# Altium schematic symbol library mastermind.SCHLIB: 732 symbols (part 3 of 5)
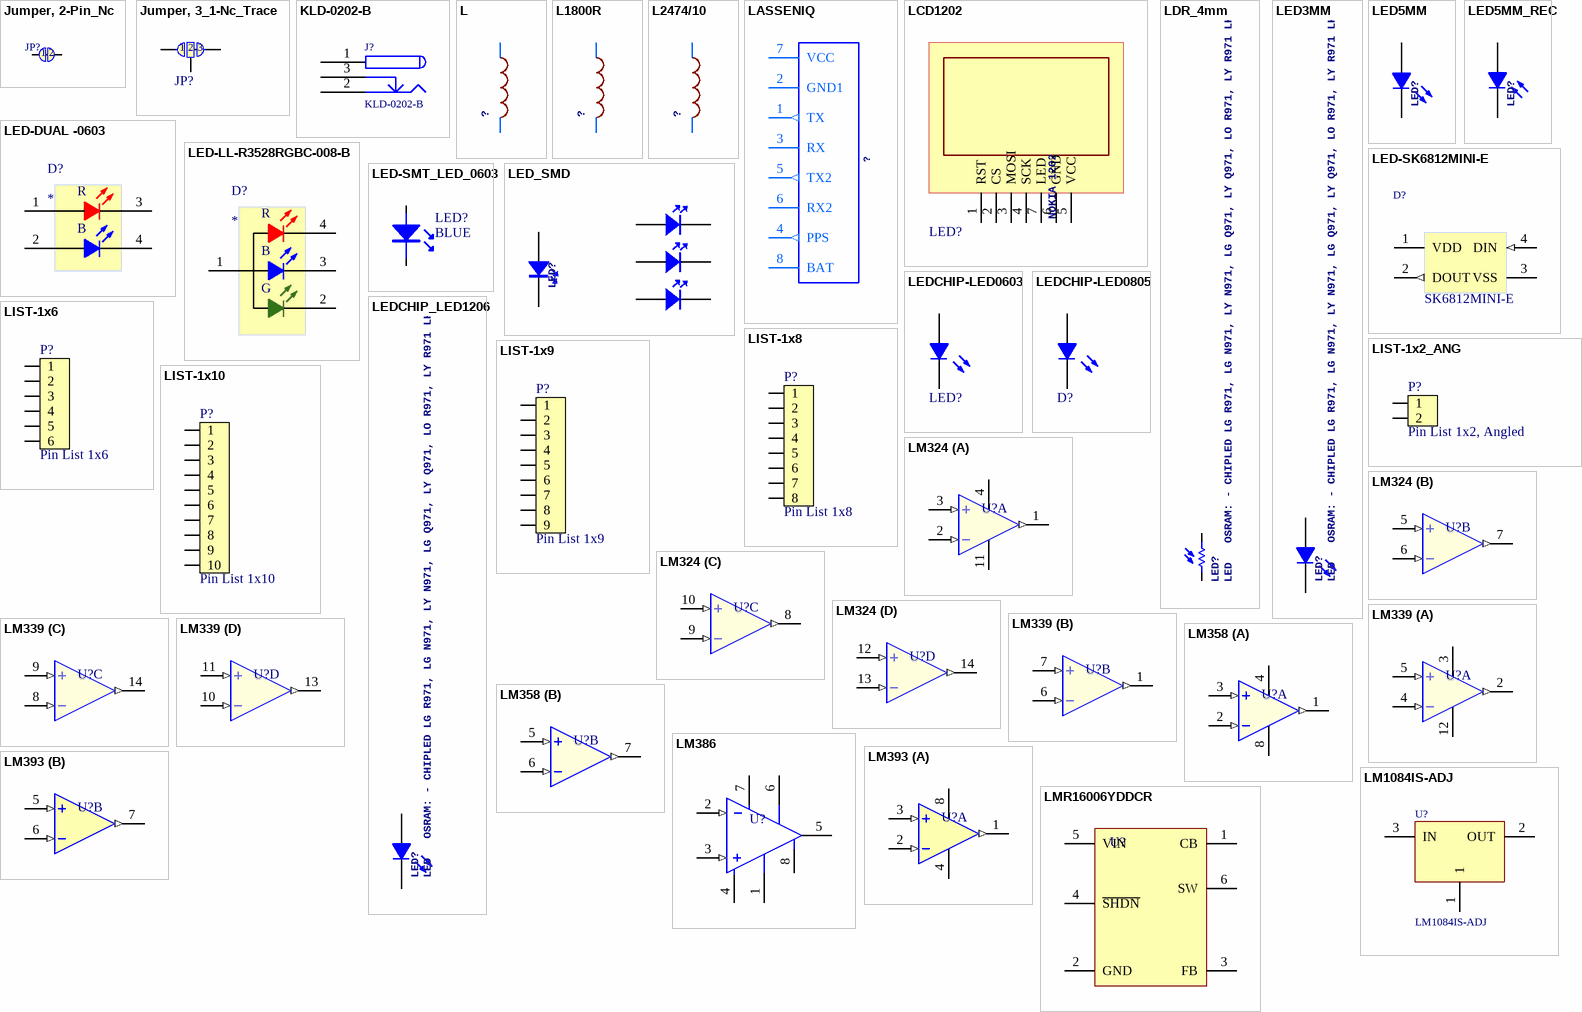
[diagram p36: symbols Jumper, 2-Pin_Nc to LMR16006YDDCR]

## LM339
designator U?, comment National LM3622 li-ion charger    http://www.ladyada.net/library/eagle  (value not drawn)
footprint TSSOP14
part A pins: 2 OA (out), 3 VCC, 4 A- (in), 5 A+ (in), 12 GND
part B pins: 1 OB (out), 6 B- (in), 7 B+ (in)
part C pins: 8 C- (in), 9 C+ (in), 14 OC (out)
part D pins: 10 D- (in), 11 D+ (in), 13 OD (out)

## LM358
designator U?  (value not drawn)
Dual Operational Amplifiers
footprint SOIC-8E (SOIC, 8-Leads, Body 4.90x3.90mm, Pitch 1.27mm, IPC Medium Density)
footprint DIL08-ROUND
part A pins: 1 OA (out), 2 A- (in), 3 A+ (in), 4 GND, 8 VCC
part B pins: 5 B+ (in), 6 B- (in), 7 OB (out)

## LM386
designator U?  (value not drawn)
Audio Amplifiers
footprint SOIC-8E (SOIC, 8-Leads, Body 4.90x3.90mm, Pitch 1.27mm, IPC Medium Density)
footprint DIL08-ROUND
pins: 1 OA, 2 A- (in), 3 A+ (in), 4 GND, 5 VCC, 6 VCC, 7 VCC, 8 VCC

## LM393
designator U?, comment LM393 OP AMP  (value not drawn)
Operational Amplifier
footprint SOP8
footprint DIL08-ROUND
part A pins: 1 OA (out), 2 A- (in), 3 A+ (in), 4 GND, 8 VCC
part B pins: 5 B+ (in), 6 B- (in), 7 OB (out)

## LM1084IS-ADJ
designator U?
5A Low Dropout Possitive Regulators
footprint TO-263
3D model to263 (PCB3D Model)
pins: 1 "Output", 2 OUT (power) "Output", 3 IN (power) "Input"

## LMR16006YDDCR
designator U?  (value not drawn)
BOM_Manufacturer: TI(Tex as Instruments); Contributor: LCSC; BOM_Supplier: LCSC; BOM_Supplier Part: C290195; BOM_Manufacturer Part: LMR16006YDDCR; BOM_JLCPCB Part Class: Extended Part; spicePre: U; spiceSymbolName: LMR16006YDDCR
footprint SOT23-6
pins: 1 CB, 2 GND, 3 FB, 4 ~{SHDN}, 5 VIN, 6 SW

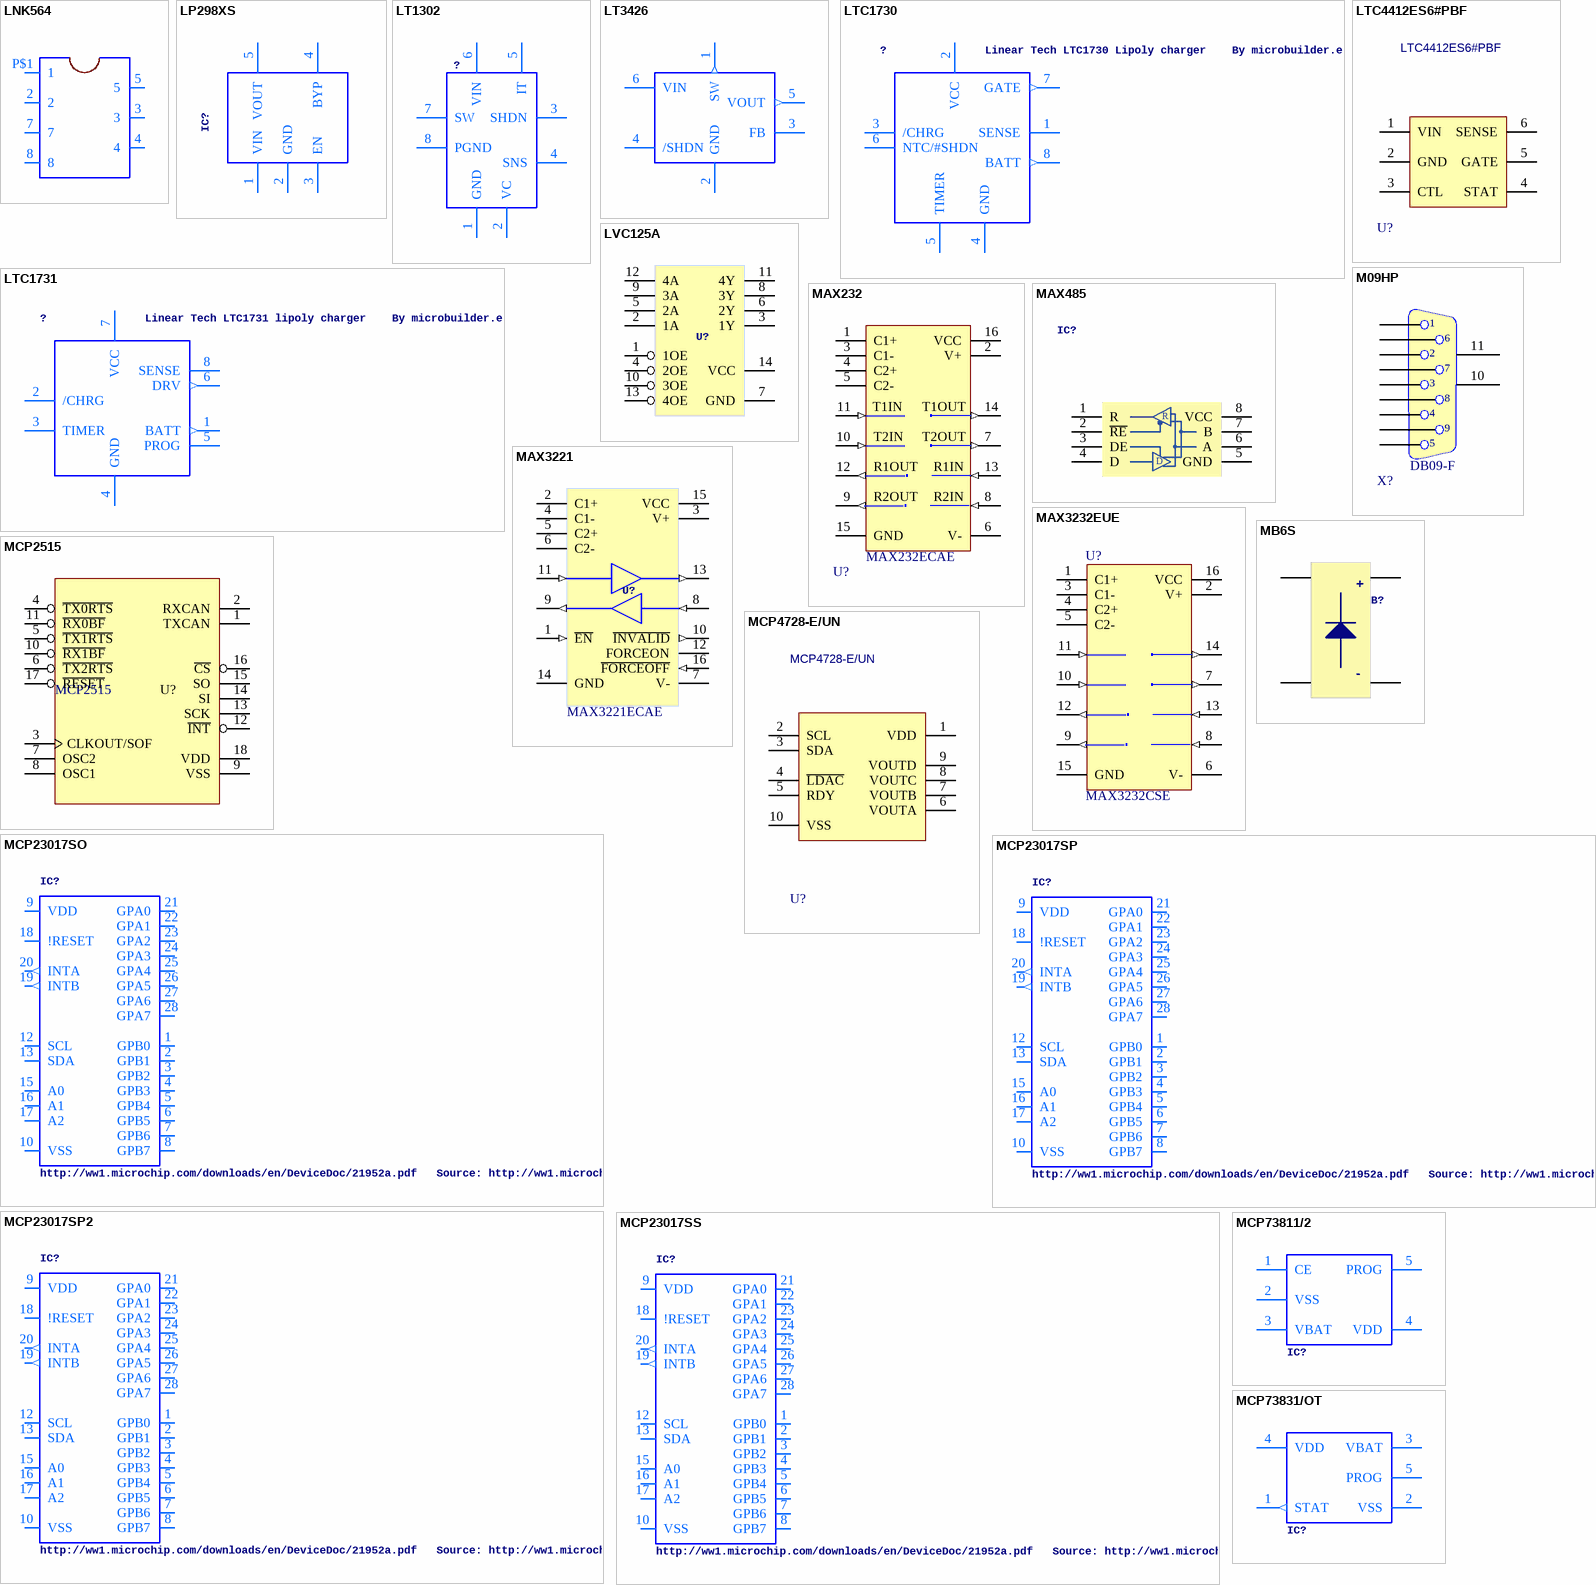
[diagram p15: symbols LNK564 to MCP73831/OT]

## LNK564
designator ?
footprint LNKPACKAGE
pins: 2, 3, 4, 5, 7, 8, P$1 1

## LP298XS
designator IC?
footprint SOT23-5L
pins: 1 VIN, 2 GND, 3 EN, 4 BYP, 5 VOUT

## LT1302
designator ?
footprint DIL08
pins: 1 GND, 2 VC, 3 SHDN, 4 SNS, 5 IT, 6 VIN, 7 SW, 8 PGND

## LT3426
designator ?, comment LT3426   1.2MHz, 2A boost converter in SOT-23    http://www.linear.com/pc/productDetail.jsp?navId=H0,C1,C1003,C1042,C1031,C1061,P8430 (Linear website)  (value not drawn)
footprint SOT23-6
pins: 1 SW (out), 2 GND (oe), 3 FB, 4 /SHDN, 5 VOUT (out), 6 VIN

## LTC1730
designator ?, comment Linear Tech LTC1730 Lipoly charger    By microbuilder.eu
footprint SO08
pins: 1 SENSE, 2 VCC (oe), 3 /CHRG, 4 GND (oe), 5 TIMER, 6 NTC/#SHDN, 7 GATE (out), 8 BATT (out)

## LTC1731
designator ?, comment Linear Tech LTC1731 lipoly charger    By microbuilder.eu
footprint SO08
pins: 1 BATT (out), 2 /CHRG, 3 TIMER, 4 GND (oe), 5 PROG, 6 DRV (out), 7 VCC (oe), 8 SENSE

## LTC4412ES6#PBF
designator U?
Manufacturer: ADI(亚德诺); Supplier: LCSC; Manufacturer Part: LTC4412ES6#PBF; Supplier Part: C107968; JLCPCB Part Class: Extended Part; spicePre: U; spiceSymbolName: LTC4412ES6#PBF
footprint SOT23-6
pins: 1 VIN, 2 GND, 3 CTL, 4 STAT, 5 GATE, 6 SENSE

## LVC125A
designator U?, comment Quad_shift_level_ic  (value not drawn)
74VHC125MCT
footprint TSSOP14
pins: 1 1OE, 2 1A, 3 1Y, 4 2OE, 5 2A, 6 2Y, 7 GND, 8 3Y, 9 3A, 10 3OE, 11 4Y, 12 4A, 13 4OE, 14 VCC

## M09HP
designator X?, comment SUB-D  (value not drawn)
GateName_1: G$1; SymbolName_1: F09; DeviceName: H; LibraryName: con-subd; DeviceSetName: F09; Package: F09H; OC_FARNELL: unknown; OC_NEWARK: unknown
footprint M09HP
pins: 1, 2, 3, 4, 5, 6, 7, 8, 9, 10 1, 11 1
text: DB09-F

## MAX232
designator U?, comment SymbolName_1: MAX232ECAE  (hidden comment: RS232 TRANSCEIVER)
GateName_1: G$1
footprint SO-16
pins: 1 C1+, 2 V+ (power), 3 C1-, 4 C2+, 5 C2-, 6 V- (power), 7 T2OUT (out), 8 R2IN (in), 9 R2OUT (out), 10 T2IN (in), 11 T1IN (in), 12 R1OUT (out), 13 R1IN (in), 14 T1OUT (out), 15 GND (power), 16 VCC (power)

## MAX485
designator IC?  (value not drawn)
RS-485/RS-422 ICs ROHS
footprint SOP8
pins: 1 R, 2 ~{RE}, 3 DE, 4 D, 5 GND (power), 6 A, 7 B (power), 8 VCC (power)

## MAX3221
designator U?, comment SymbolName_1: MAX3221ECAE  (hidden comment: RS232 TRANSCEIVER)
GateName_1: G$1
footprint SSOP16
pins: 1 ~{EN} (in), 2 C1+, 3 V+, 4 C1-, 5 C2+, 6 C2-, 7 V-, 8 (in), 9 (out), 10 ~{INVALID} (out), 11 (in), 12 FORCEON, 13 (out), 14 GND, 15 VCC, 16 ~{FORCEOFF} (in)

## MAX3232EUE
designator U?, comment MAX3232CSE
3.0V TO 5.5V, Low-Power, up to 1Mbps, True RS-232 Transceiver Using Four 0.1µF External Capacitor; Manufacturer: Maxim,ST; Package Information: Latest Revision: 21-0066 C; Class I: Communication; Published: 16-Jan-2001; Revision: July-2002: Re-released for DXP Platform.; Datasheet: Latest Revision: Mar-1999; Package Reference: TSSOP16; Publisher: Altium Limited; Class II: Transceiver; Fitted: True
footprint SO-G16
pins: 1 C1+, 2 V+ (power), 3 C1-, 4 C2+, 5 C2-, 6 V- (power), 7 T2OUT (out), 8 R2IN (in), 9 R2OUT (out), 10 T2IN (in), 11 T1IN (in), 12 R1OUT (out), 13 R1IN (in), 14 T1OUT (out), 15 GND (power), 16 VCC (power)

## MB6S
designator B?
footprint MBS
pins: +, -, AC1, AC2

## MCP2515
designator U?
CAN Controller; Manufacturer: Tokmas(托克马斯); Symbol: MCP2515-I; Add into BOM: yes; Device: MCP2515-I; Supplier: LCSC; Supplier Part: C5250735; Manufacturer Part: MCP2515-I; JLCPCB Part Class: Extended Part; LCSC Part Name: CAN芯片; Supplier Footprint: TSSOP-20; Datasheet: https://atta.szlcsc.com/upload/public/pdf/source/20221108/54102364C5045B746FF767DA10992A5D.pdf; Convert to PCB: yes
footprint SOIC-18_L11.6-W7.5-P1.27-LS10.3-BL
pins: 1 TXCAN, 2 RXCAN, 3 CLKOUT/SOF, 4 ~{TX0RTS}, 5 ~{TX1RTS}, 6 ~{TX2RTS}, 7 OSC2, 8 OSC1, 9 VSS, 10 ~{RX1BF}, 11 ~{RX0BF}, 12 ~{INT}, 13 SCK, 14 SI, 15 SO, 16 ~{CS}, 17 ~{RESET}, 18 VDD

## MCP4728-E/UN
designator U?
12Bit MSOP-10 Digital To Analog Converters (DACs); Manufacturer: MICROCHIP(美国微芯); Contributor: LCSC; Supplier: LCSC; Supplier Part: C108207; Manufacturer Part: MCP4728-E/UN; JLCPCB Part Class: Extended Part; spicePre: U; spiceSymbolName: MCP4728-E/UN
footprint MSOP-10_L3.0-W3.0-P0.50-LS5.0-TL
pins: 1 VDD, 2 SCL, 3 SDA, 4 ~{LDAC}, 5 RDY, 6 VOUTA, 7 VOUTB, 8 VOUTC, 9 VOUTD, 10 VSS

## MCP23017SO
designator IC?, comment http://ww1.microchip.com/downloads/en/DeviceDoc/21952a.pdf   Source: http://ww1.microchip.com/downloads/en/DeviceDoc/21952a.pdf
footprint SO28W
pins: 1 GPB0, 2 GPB1, 3 GPB2, 4 GPB3, 5 GPB4, 6 GPB5, 7 GPB6, 8 GPB7, 9 VDD (power), 10 VSS (power), 12 SCL, 13 SDA, 15 A0, 16 A1, 17 A2, 18 !RESET, 19 INTB (out), 20 INTA (out), 21 GPA0, 22 GPA1, 23 GPA2, 24 GPA3, 25 GPA4, 26 GPA5, 27 GPA6, 28 GPA7

## MCP23017SP
designator IC?, comment http://ww1.microchip.com/downloads/en/DeviceDoc/21952a.pdf   Source: http://ww1.microchip.com/downloads/en/DeviceDoc/21952a.pdf
footprint DIL28-3
pins: 1 GPB0, 2 GPB1, 3 GPB2, 4 GPB3, 5 GPB4, 6 GPB5, 7 GPB6, 8 GPB7, 9 VDD (power), 10 VSS (power), 12 SCL, 13 SDA, 15 A0, 16 A1, 17 A2, 18 !RESET, 19 INTB (out), 20 INTA (out), 21 GPA0, 22 GPA1, 23 GPA2, 24 GPA3, 25 GPA4, 26 GPA5, 27 GPA6, 28 GPA7

## MCP23017SP2
designator IC?, comment http://ww1.microchip.com/downloads/en/DeviceDoc/21952a.pdf   Source: http://ww1.microchip.com/downloads/en/DeviceDoc/21952a.pdf
footprint DIL28-3-ROUND
pins: 1 GPB0, 2 GPB1, 3 GPB2, 4 GPB3, 5 GPB4, 6 GPB5, 7 GPB6, 8 GPB7, 9 VDD (power), 10 VSS (power), 12 SCL, 13 SDA, 15 A0, 16 A1, 17 A2, 18 !RESET, 19 INTB (out), 20 INTA (out), 21 GPA0, 22 GPA1, 23 GPA2, 24 GPA3, 25 GPA4, 26 GPA5, 27 GPA6, 28 GPA7

## MCP23017SS
designator IC?, comment http://ww1.microchip.com/downloads/en/DeviceDoc/21952a.pdf   Source: http://ww1.microchip.com/downloads/en/DeviceDoc/21952a.pdf
footprint SSOP28
pins: 1 GPB0, 2 GPB1, 3 GPB2, 4 GPB3, 5 GPB4, 6 GPB5, 7 GPB6, 8 GPB7, 9 VDD (power), 10 VSS (power), 12 SCL, 13 SDA, 15 A0, 16 A1, 17 A2, 18 !RESET, 19 INTB (out), 20 INTA (out), 21 GPA0, 22 GPA1, 23 GPA2, 24 GPA3, 25 GPA4, 26 GPA5, 27 GPA6, 28 GPA7

## MCP73811/2
designator IC?, comment MCP73811 and MCP73812   Simple, Miniature Single-Cell, Fully Integrated Li-Ion / Li-Polymer Charge Management Controllers  SOT-23-5 package, no indicator LED but with adjustable current, small and very inexpensive  (value not drawn)
footprint SOT23-5L
pins: 1 CE, 2 VSS (power), 3 VBAT, 4 VDD (power), 5 PROG

## MCP73831/OT
designator IC?, comment MCP73831/2   Miniature Single-Cell, Fully Integrated Li-Ion, Li-Polymer Charge Management Controllers.    Nice and small simple lipoly charge controller, with adjustable current and status output (LED)    http://www.ladyada.net/library/pcb/eaglelibrary.html  (value not drawn)
footprint SOT23-5L
pins: 1 STAT (out), 2 VSS (power), 3 VBAT, 4 VDD (power), 5 PROG

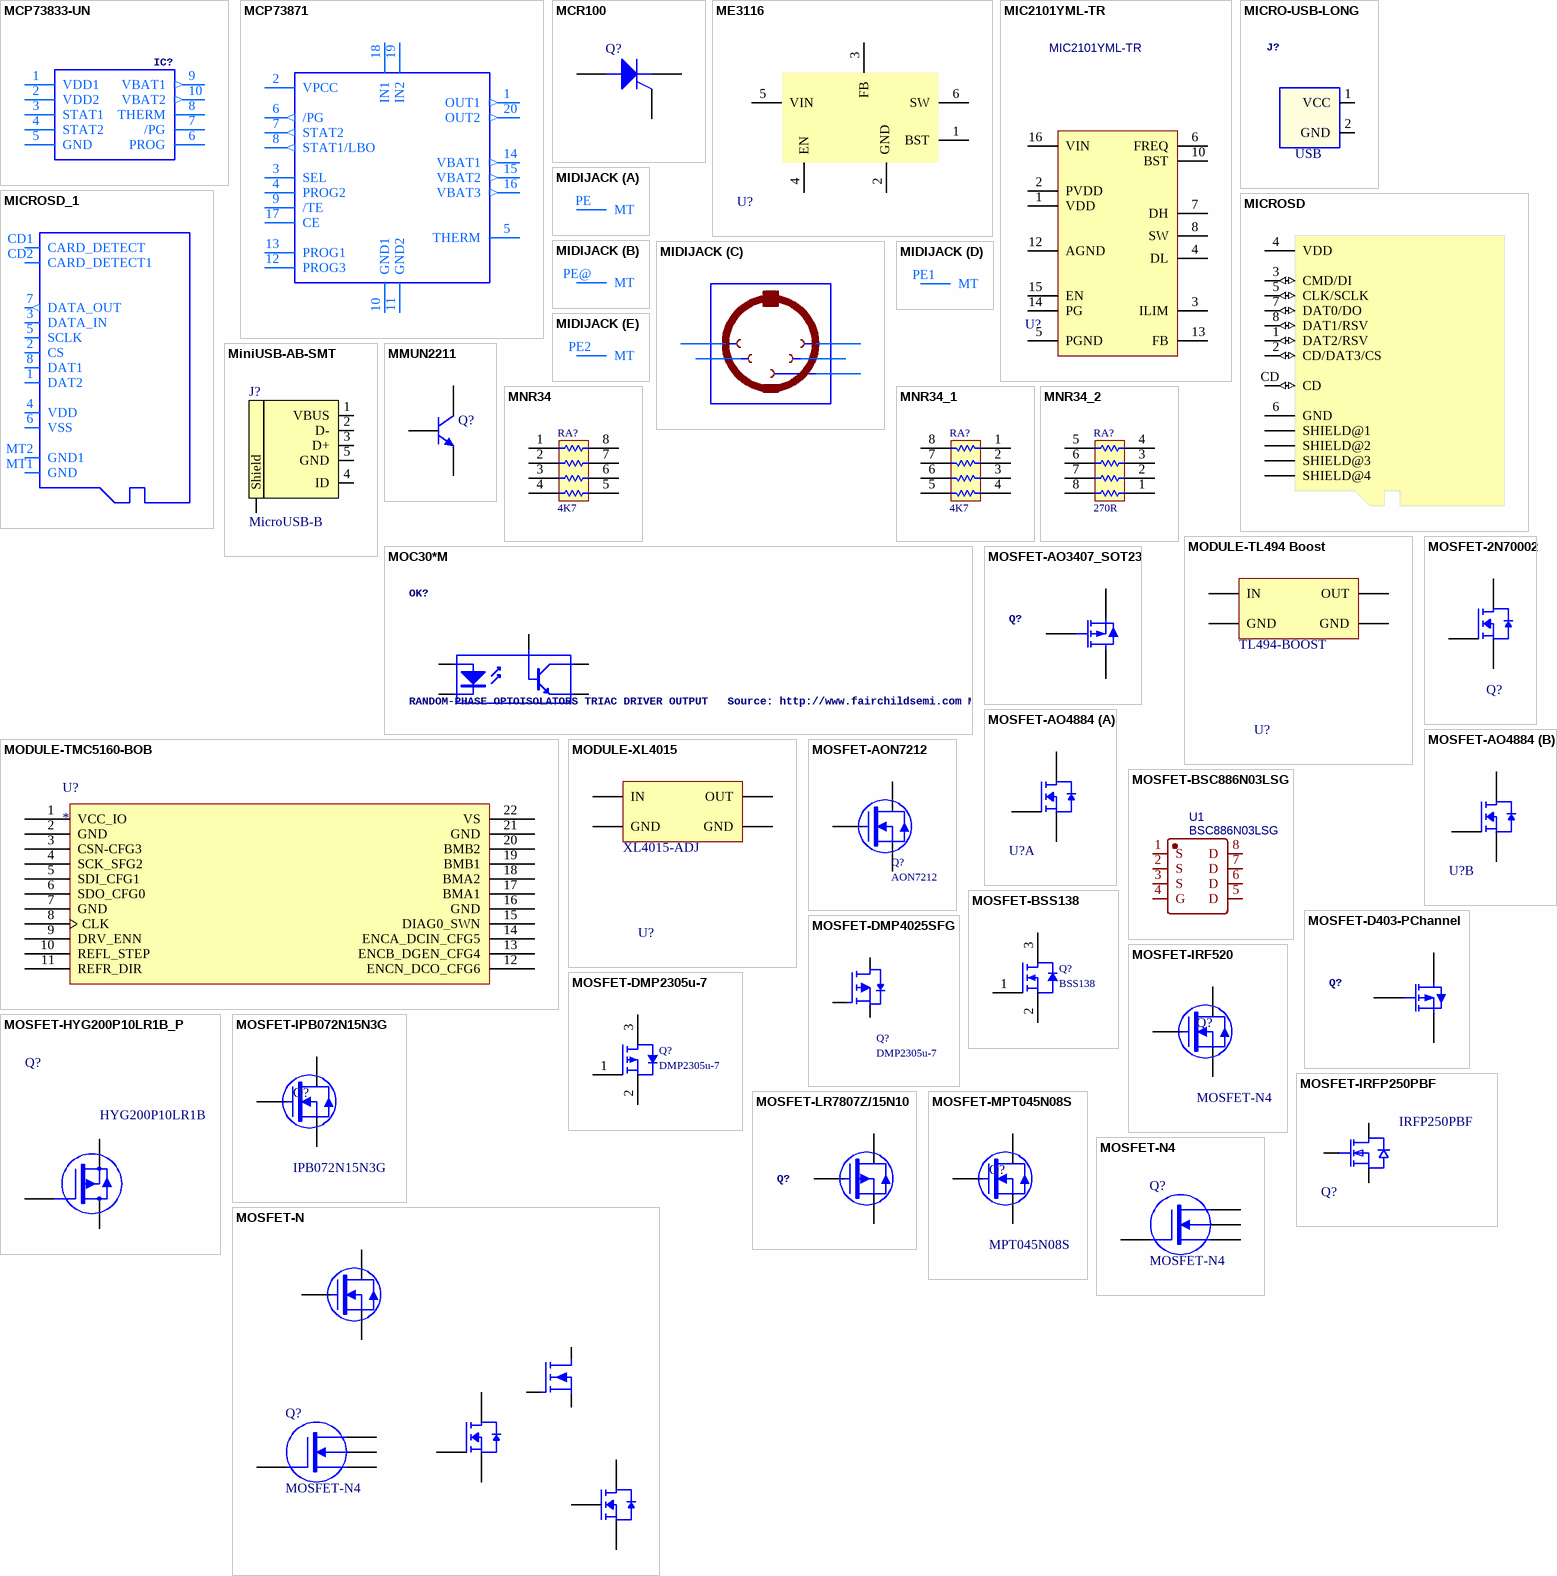
[diagram p16: symbols MCP73833-UN to MOSFET-N4]

## MCP73833-UN
designator IC?
footprint MSOP10
pins: 1 VDD1 (power), 2 VDD2 (power), 3 STAT1, 4 STAT2, 5 GND (power), 6 PROG, 7 /PG, 8 THERM, 9 VBAT1 (out), 10 VBAT2 (out)

## MCP73871
designator IC?
footprint QFN20
pins: 1 OUT1 (out), 2 VPCC, 3 SEL, 4 PROG2, 5 THERM, 6 /PG (out), 7 STAT2 (out), 8 STAT1/LBO (out), 9 /TE, 10 GND1 (power), 11 GND2 (power), 12 PROG3, 13 PROG1, 14 VBAT1 (out), 15 VBAT2 (out), 16 VBAT3 (out), 17 CE, 18 IN1, 19 IN2, 20 OUT2 (out)

## MCR100
designator Q?
Silicon Controlled Rectifier; Published: 8-Jun-2000; LatestRevisionDate: 17-Jul-2002; LatestRevisionNote: Re-released for DXP Platform.; PackageReference: TO-220-AB; Publisher: Altium Limited; Code_JEDEC: TO-220-AB
simulation model SCR (Spice Subcircuit)
footprint SOT23
pins: 1 K, 2 G, 3 A

## ME3116
designator U?  (value not drawn)
DC-DC Converters SOT-23-6
footprint SOT23-6
pins: 1 BST (power), 2 GND, 3 FB, 4 EN (power), 5 VIN, 6 SW

## MIC2101YML-TR
designator U?
DC-DC Converters MLF-16; Manufacturer: MICROCHIP(美国微芯); Contributor: lcsc; Supplier: LCSC; Supplier Part: C621528; Manufacturer Part: MIC2101YML-TR; spicePre: U; spiceSymbolName: MIC2101YML-TR
footprint VQFN-16_L3.0-W3.0-P0.50-BL-EP1.7
pins: 1 VDD, 2 PVDD, 3 ILIM, 4 DL, 5 PGND, 6 FREQ, 7 DH, 8 SW, 9 GND hidden to GND, 10 BST, 11 GND hidden to GND, 12 AGND, 13 FB, 14 PG, 15 EN, 16 VIN, 17 GND hidden to GND

## MICRO-USB-LONG
designator J?
GateName_1: G$1; SymbolName_1: MICRO-USB-LONG; LibraryName: microusb; DeviceSetName: MICRO-USB-LONG; Package: MICRO_USB_LONG
footprint MICRO_USB_LONG
pins: 1 VCC (power), 2 GND (power)
text: USB

## MICROSD
designator ?, comment Micro-SD / Transflash card holder with SPI pinout   For the 3M # 2908-05WB-MG and/or 4UCON #19656 push-push type  (value not drawn)
GateName_1: G$1; DeviceSetName: MICROSD; SymbolName_1: TRANSFLASH; LibraryName: micro-sd; Package: C12075
footprint C12075
pins: 1 DAT2/RSV (io), 2 CD/DAT3/CS (io), 3 CMD/DI (io), 4 VDD (power), 5 CLK/SCLK (io), 6 GND (power), 7 DAT0/DO (io), 8 DAT1/RSV (io), CD (io), GND@1 SHIELD@1 (power), GND@2 SHIELD@2 (power), GND@3 SHIELD@3 (power), GND@4 SHIELD@4 (power)

## MICROSD_1
designator ?, comment Micro-SD / Transflash card holder with SPI pinout   For the 3M # 2908-05WB-MG and/or 4UCON #19656 push-push type  (value not drawn)
footprint MICROSD
pins: 1 DAT2, 2 CS, 3 DATA_IN, 4 VDD (oe), 5 SCLK, 6 VSS (oe), 7 DATA_OUT (out), 8 DAT1, CD1 CARD_DETECT, CD2 CARD_DETECT1, MT1 GND (oe), MT2 GND1 (oe)

## MIDIJACK
designator ?, comment DIN 5 jack also known as MIDI jackA modification of conn-hirshman:MAB5SH with two options for the grounding 'teeth'  (value not drawn)
footprint CP-2350
part A pins: PE MT
part B pins: PE@ MT
part C pins: 1, 2, 3, 4, 5
part D pins: PE1 MT
part E pins: PE2 MT

## MiniUSB-AB-SMT
designator J?, comment MicroUSB-B
MicroUSB-B-SMT; Part Number: USB-Micro-B-RA-SMD-PiP; Manufacturer: Allen Creations Corp.; Manufacturer Part Number: AJU55-BS2111-L; 2nd source part number: 609-4616-1-ND; Artikkelnr Noca: 55029020; Artikkelnr Simpro: N.A.; Datasheet: \\hizz\pro\app9717\Datasheet\connectores\Allen Creations Corp\AJU-211.pdf; Footprint Doc: USB-Micro-B-RA-SMD-PiP; LatestRevisionDate: 2016-04-21; Pin Count: 5; Publisher: Nordic Semiconductor; Published: 2014-10-07; Value: MicroUSB-B; Note: *; Supplier: Cabcon; Supplier part number: AJU55-BS2111-L; 2nd source Supplier: Digi-Key
footprint USB-Micro-B-RA-SMD-PiP
pins: 1 VBUS (power), 2 D-, 3 D+, 4 ID, 5 GND (power), 6 Shield (power)

## MMUN2211
designator Q?
NPN Bipolar Transistor; Published: 8-Jun-2000; LatestRevisionDate: 17-Jul-2002; LatestRevisionNote: Re-released for DXP Platform.; PackageReference: TO-226-AA; Publisher: Altium Limited; PackageDescription: TO, Flat Index; 3 In-Line, Axial Leads; Body Dia. 4.8mm; Leads 0.55 x 0.51 mm (max); Code_JEDEC: TO-226-AA
simulation model NPN
signal-integrity model NPN
footprint SOT23
pins: 1 B, 2 E, 3 C

## MNR34
designator RA?, comment 4K7
3216x4 Resistor Array; AEMS Code: 1300330
footprint MNR34
footprint MNR34T
pins: 1, 2, 3, 4, 5, 6, 7, 8

## MNR34_1
designator RA?, comment 4K7
3216x4 Resistor Array; AEMS Code: 1300330
footprint MNR34
footprint MNR34T
pins: 1, 2, 3, 4, 5, 6, 7, 8

## MNR34_2
designator RA?, comment 270R
3216x4 Resistor Array; AEMS Code: 1310010
footprint MNR34
pins: 1, 2, 3, 4, 5, 6, 7, 8

## MOC30*M
designator OK?, comment RANDOM-PHASE OPTOISOLATORS TRIAC DRIVER OUTPUT   Source: http://www.fairchildsemi.com MOC3020-M.pdf
footprint DIL06F
pins: 1 A "Anode", 2 K "Cathode", 4 C "Collector", 5 B "Base", 6 E "Emitter"

## MODULE-TL494 Boost
designator U?
footprint MODULE-TL494
pins: 1 IN, 2 GND, 3 OUT, 4 GND
text: TL494-BOOST

## MODULE-TMC5160-BOB
designator U?
This board was developed for applications and installations where space is premium and projects are made as permanent set ups. Small, available in 3.3 V and 5 V versions, powered by ATmega328P.; MP: Arduino Pro Mini; MF: Arduino; Price: None; Availability: Not in stock; Package: None; Value: *; SnapEDA_Link: https://www.snapeda.com/parts/Arduino%20Pro%20Mini/Arduino/view-part/?ref=snap; Check_prices: https://www.snapeda.com/parts/Arduino%20Pro%20Mini/Arduino/view-part/?ref=eda
footprint Module_tmc5160_bob
pins: 1 VCC_IO (power), 2 GND (power), 3 CSN-CFG3, 4 SCK_SFG2, 5 SDI_CFG1, 6 SDO_CFG0, 7 GND, 8 CLK, 9 DRV_ENN, 10 REFL_STEP, 11 REFR_DIR, 12 ENCN_DCO_CFG6, 13 ENCB_DGEN_CFG4, 14 ENCA_DCIN_CFG5, 15 DIAG0_SWN, 16 GND, 17 BMA1, 18 BMA2, 19 BMB1, 20 BMB2, 21 GND (power), 22 VS (power)

## MODULE-XL4015
designator U?
footprint MODULE-XL4015
pins: 1 IN, 2 GND, 3 OUT, 4 GND
text: XL4015-ADJ

## MOSFET-2N70002
designator Q?, comment 2N7002  (value not drawn)
N-Channel Mosfet 2N7002E - 60V 260mA SOT23
footprint SOT23
pins: 1 G "Gate", 2 S "Drain", 3 D "Source"

## MOSFET-AO3407_SOT23
designator Q?
footprint SOT23
pins: 1 G, 2 S, 3 D

## MOSFET-AO4884
designator U?, comment AO4884  (value not drawn)
Dual N-Channel 40V 10A  27mΩ  SOP8; Manufacturer: HXY MOSFET(华轩阳电子); Manufacturer Part: AO4884-HXY; Contributor: lcsc; Supplier: LCSC; Supplier Part: C5148656; JLCPCB Part Class: Extended Part; spicePre: U; spiceSymbolName: AO4884_C5148656
footprint SOIC-8E (SOIC, 8-Leads, Body 4.90x3.90mm, Pitch 1.27mm, IPC Medium Density); pin to pad 5>5+6 7>7+8
part A pins: 1 S "Drain", 2 G "Gate", 7 D "Source"
part B pins: 3 S "Drain", 4 G "Gate", 5 D "Source"

## MOSFET-AON7212
designator Q?, comment AON7212
N Channel Mosfet 30V 40A dfn-8
footprint POWERDI3333-8_L3.3-W3.3-P0.65-BL
pins: 1 G, 2 S, 3 D

## MOSFET-BSC886N03LSG
designator U1, comment BSC886N03LSG
Manufacturer: Infineon(英飞凌); Contributor: lcsc; Supplier: LCSC; Supplier Part: C3275891; Manufacturer Part: BSC886N03LSG; spicePre: U; spiceSymbolName: BSC886N03LSG
footprint PG-TDSON-8_L5.0-W6.0-P1.27-BL-EP
pins: 1 S, 2 S, 3 S, 4 G, 5 D, 6 D, 7 D, 8 D

## MOSFET-BSS138
designator Q?, comment BSS138
N Channel Mosfet
footprint SOT23
pins: 1 "Gate", 2 "Source", 3 "Drain"

## MOSFET-D403-PChannel
designator Q?
footprint TO252
pins: 1 G, 2 S, 3 D

## MOSFET-DMP2305u-7
designator Q?, comment DMP2305u-7
P Channel Mosfet
footprint SOT23
pins: 1 "Gate", 2 "Source", 3 "Drain"

## MOSFET-DMP4025SFG
designator Q?, comment DMP2305u-7
P Channel Mosfet
footprint POWERDI3333-8_L3.3-W3.3-P0.65-BL
pins: 1 G, 2 S, 3 D

## MOSFET-HYG200P10LR1B_P
designator Q?, comment HYG200P10LR1B
P-Channel MOSFET,  100V 80A Externally Terminated Substrate; Published: 24-Mar-1999; LatestRevisionDate: 29-May-2009; LatestRevisionNote: IPC-7351 Footprint Added.; PackageVersion: Sep-2000; PackageReference: SOT-343; Publisher: Altium Limited; PackageDescription: 4-Pin SOT-343 Package 1.3 mm Pitch, 2.1 mm Lead Span
footprint TO-263-2
pins: 1 G, 2 D, 3 S

## MOSFET-IPB072N15N3G
designator Q?, comment IPB072N15N3G
N-Channel MOSFET,  100V 80A  7.2mΩ; Published: 24-Mar-1999; LatestRevisionDate: 29-May-2009; LatestRevisionNote: IPC-7351 Footprint Added.; PackageVersion: Sep-2000; PackageReference: SOT-343; Publisher: Altium Limited; PackageDescription: 4-Pin SOT-343 Package 1.3 mm Pitch, 2.1 mm Lead Span
footprint TO-263-2
pins: 1 G, 2 D, 3 S

## MOSFET-IRF520
designator Q?, comment MOSFET-N4
N-Channel MOSFET; Published: 24-Mar-1999; LatestRevisionDate: 29-May-2009; LatestRevisionNote: IPC-7351 Footprint Added.; PackageVersion: Sep-2000; PackageReference: SOT-343; Publisher: Altium Limited; PackageDescription: 4-Pin SOT-343 Package 1.3 mm Pitch, 2.1 mm Lead Span
footprint TO220
pins: 1 G, 2 D, 3 S

## MOSFET-IRFP250PBF
designator Q?, comment IRFP250PBF
N-Channel; Manufacturer: VISHAY(威世); Add into BOM: yes; Drain Source On Resistance (RDS(on)@Vgs,Id): 85mΩ@10V,18A; Gate Threshold Voltage (Vgs(th)@Id): 4V@250uA; Total Gate Charge (Qg@Vgs): 140nC@10V; Input Capacitance (Ciss@Vds): 2.8nF@25V; Symbol: IRFP250PBF; Device: IRFP250PBF; Supplier: LCSC; Manufacturer Part: IRFP250PBF; Supplier Part: C11749; JLCPCB Part Class: Extended Part; LCSC Part Name: N沟道 耐压:200V 电流:30A; Supplier Footprint: TO-247AC-3; Datasheet: https://atta.szlcsc.com/upload/public/pdf/source/20130302/1457706596399.pdf; Convert to PCB: yes; Operating Temperature: -55℃~+150℃@(Tj); Name: IRFP250PBF
footprint TO-247AC-3_L15.8-W5.0-P5.46-L
pins: 1 G, 2 D, 3 S

## MOSFET-LR7807Z/15N10
designator Q?
P-
footprint TO252
footprint TO254P-3N
pins: 1 G, 2 D, 3 S

## MOSFET-MPT045N08S
designator Q?, comment MPT045N08S
N-Channel MOSFET,  85V 138A  4.4mΩ; Published: 24-Mar-1999; LatestRevisionDate: 29-May-2009; LatestRevisionNote: IPC-7351 Footprint Added.; PackageVersion: Sep-2000; PackageReference: SOT-343; Publisher: Altium Limited; PackageDescription: 4-Pin SOT-343 Package 1.3 mm Pitch, 2.1 mm Lead Span
footprint TO-263-2
pins: 1 G, 2 D, 3 S

## MOSFET-N
designator Q?, comment MOSFET-N4
N-Channel MOSFET; Published: 24-Mar-1999; LatestRevisionDate: 29-May-2009; LatestRevisionNote: IPC-7351 Footprint Added.; PackageVersion: Sep-2000; PackageReference: SOT-343; Publisher: Altium Limited; PackageDescription: 4-Pin SOT-343 Package 1.3 mm Pitch, 2.1 mm Lead Span
pins: 1 G, 1 G "Gate", 1 G, 1 G, 1 G "Gate", 2 D, 2 S "Drain", 2 S, 2 D, 2 S "Drain", 3 U, 3 D "Source", 3 D, 3 D "Source", 4 S, 4 S

## MOSFET-N4
designator Q?
N-Channel MOSFET, Externally Terminated Substrate; Published: 24-Mar-1999; LatestRevisionDate: 29-May-2009; LatestRevisionNote: IPC-7351 Footprint Added.; PackageVersion: Sep-2000; PackageReference: SOT-343; Publisher: Altium Limited; PackageDescription: 4-Pin SOT-343 Package 1.3 mm Pitch, 2.1 mm Lead Span
footprint SOT-343_N (SOT343, 4-Leads, Body 2x1.3 mm, Pitch 1.3mm, Lead Span 2.1mm, IPC Medium Density)
footprint SOT-343_L (SOT343, 4-Leads, Body 2x1.3 mm, Pitch 1.3mm, Lead Span 2.1mm, IPC High Density)
footprint SOT-343_M (SOT343, 4-Leads, Body 2x1.3 mm, Pitch 1.3mm, Lead Span 2.1mm, IPC Low Density)
simulation model NMOS (MOSFET-N)
pins: 1 G, 2 D, 3 U, 4 S

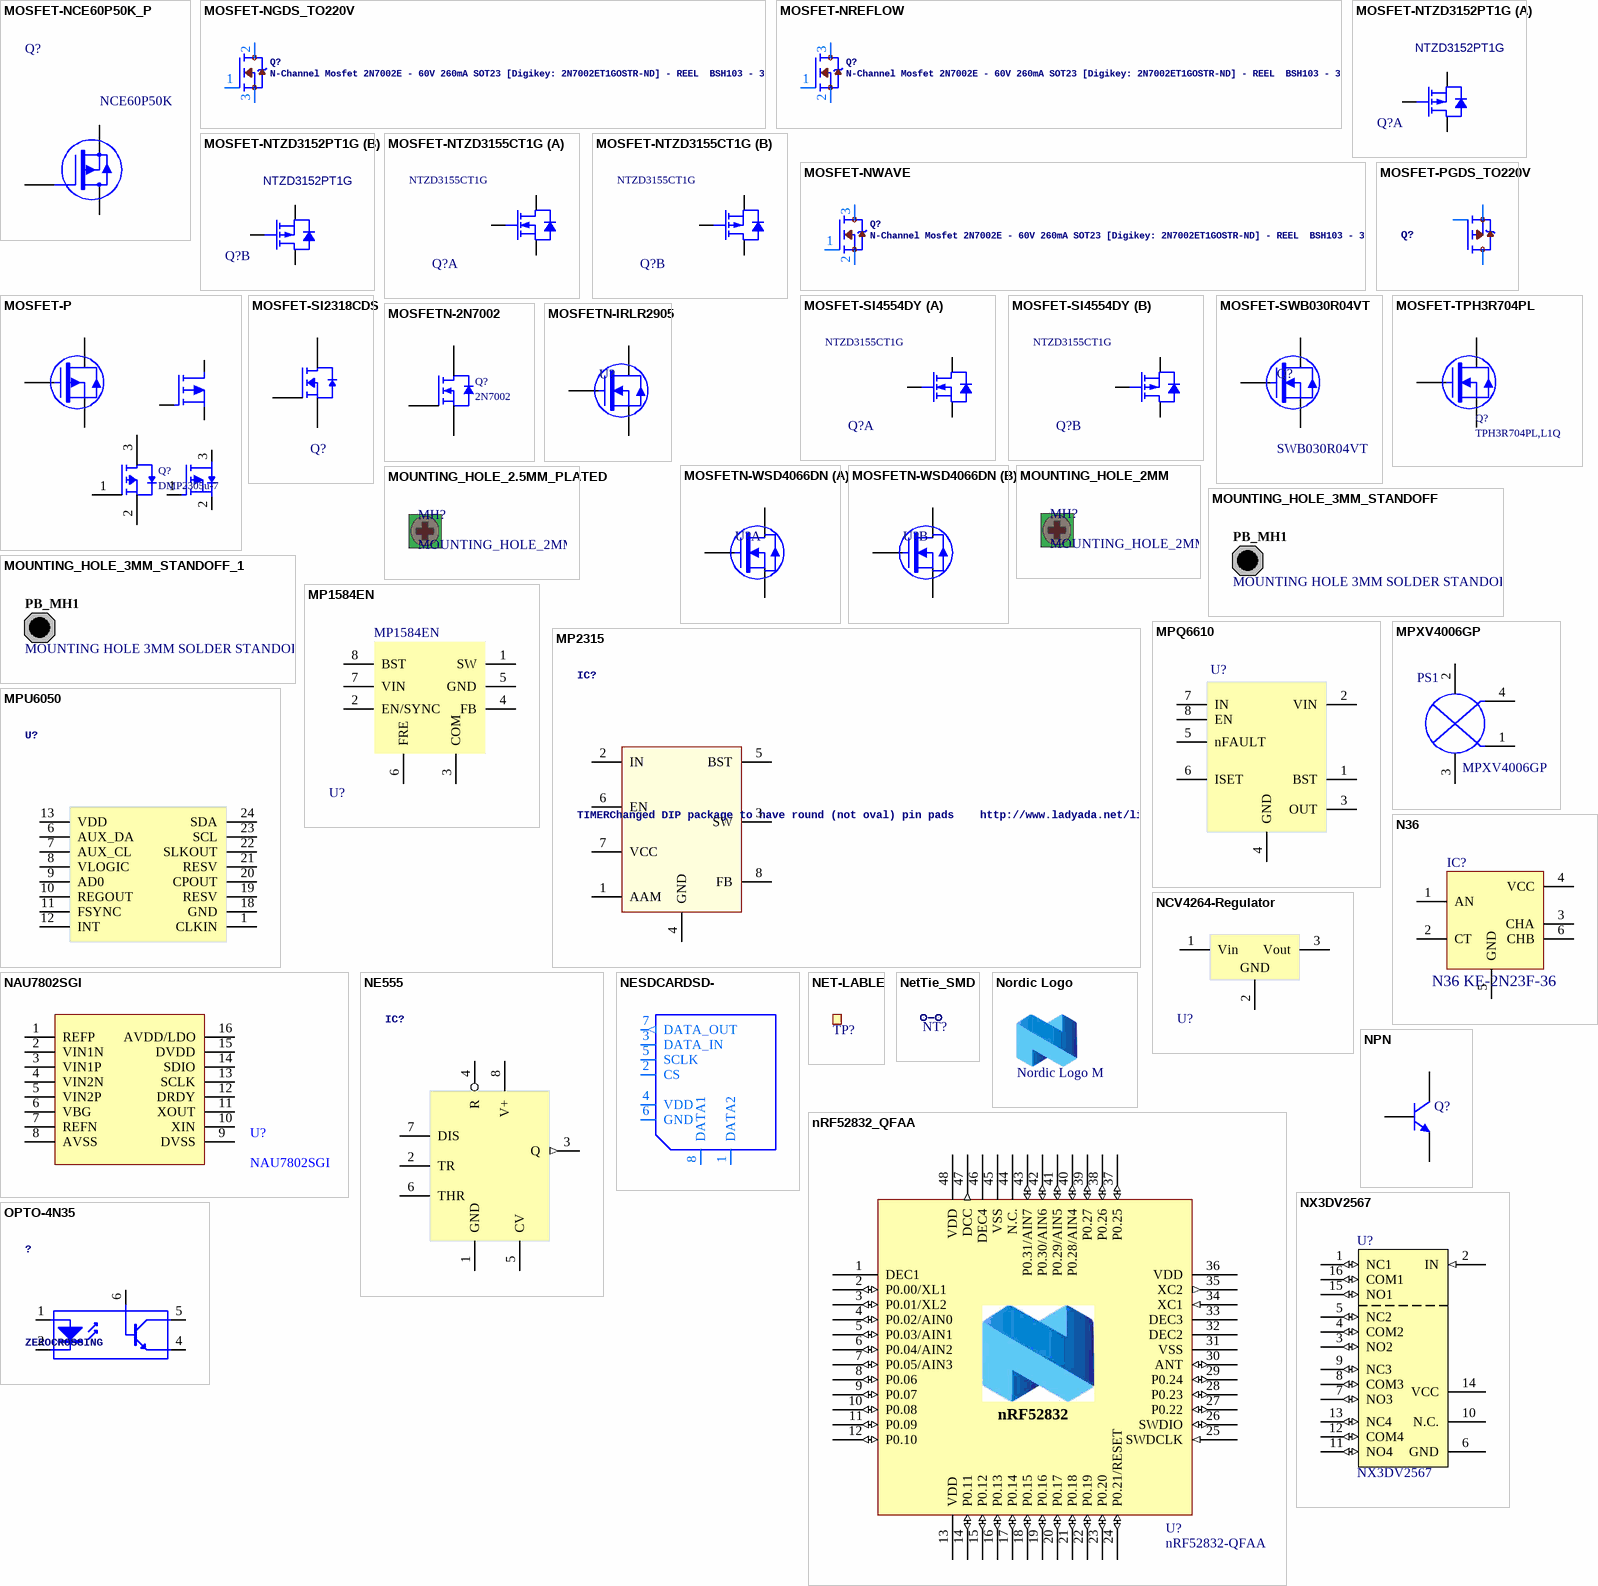
[diagram p17: symbols MOSFET-NCE60P50K_P to OPTO-4N35]

## MOSFET-NCE60P50K_P
designator Q?, comment NCE60P50K
P-Channel MOSFET,  60V 50A; Published: 24-Mar-1999; LatestRevisionDate: 29-May-2009; LatestRevisionNote: IPC-7351 Footprint Added.; PackageVersion: Sep-2000; PackageReference: SOT-343; Publisher: Altium Limited; PackageDescription: 4-Pin SOT-343 Package 1.3 mm Pitch, 2.1 mm Lead Span
footprint TO252
pins: 1 G, 2 S, 3 D

## MOSFET-NGDS_TO220V
designator Q?, comment N-Channel Mosfet 2N7002E - 60V 260mA SOT23 [Digikey: 2N7002ET1GOSTR-ND] - REEL  BSH103 - 30V 850mA SOT23 [Digikey: 568-5013-1-ND]
footprint TO220V
pins: 1 G, 2 D, 3 S

## MOSFET-NREFLOW
designator Q?, comment N-Channel Mosfet 2N7002E - 60V 260mA SOT23 [Digikey: 2N7002ET1GOSTR-ND] - REEL  BSH103 - 30V 850mA SOT23 [Digikey: 568-5013-1-ND]
footprint SOT23
pins: 1 G, 2 S, 3 D

## MOSFET-NTZD3152PT1G
designator Q?, comment NTZD3152PT1G
Dual P-Channel MOSFET 20V 1A; Manufacturer: TECH PUBLIC(台舟); Contributor: lcsc; Supplier: LCSC; Supplier Part: C7472928; Manufacturer Part: NTZD3152PT1G; spicePre: U; spiceSymbolName: NTZD3152PT1G_C7472928
footprint SOT-563_L1.6-W1.2-P0.50-LS1.6-BR
part A pins: 1 S, 2 G, 6 D
part B pins: 3 D, 4 S, 5 G

## MOSFET-NTZD3155CT1G
designator Q?, comment NTZD3155CT1G
N- and P-Channel MOSFET 20V; Manufacturer Name: ONSemi; Manufacturer Part No.: NTZD3155CT1G
footprint SOTFL50P160X60-6N
part A pins: 1 S, 2 G, 6 D
part B pins: 3 D, 4 S, 5 G

## MOSFET-NWAVE
designator Q?, comment N-Channel Mosfet 2N7002E - 60V 260mA SOT23 [Digikey: 2N7002ET1GOSTR-ND] - REEL  BSH103 - 30V 850mA SOT23 [Digikey: 568-5013-1-ND]
footprint SOT23-W
pins: 1 G, 2 S, 3 D

## MOSFET-P
designator Q?, comment DMP2305u-7
P Channel Mosfet
pins: 1 "Gate", 1 G, 1 G, 1 G, 2 "Source", 2 S, 2 D, 2 D, 3 "Drain", 3 D, 3 S, 4 S

## MOSFET-PGDS_TO220V
designator Q?
footprint TO220V
pins: 1 G, 2 D, 3 S

## MOSFET-SI2318CDS
designator Q?, comment SI2318CDS  (value not drawn)
N-Channel Mosfet- 40V 5.6A
footprint SOT23
pins: 1 G "Gate", 2 S "Drain", 3 D "Source"

## MOSFET-SI4554DY
designator Q?, comment Manufacturer Part No.: NTZD3155CT1G  (hidden comment: Verfiy PinS first)
N&P-Channel MOSFET 40V 8A; Manufacturer Name: ONSemi
footprint SOIC-8E (SOIC, 8-Leads, Body 4.90x3.90mm, Pitch 1.27mm, IPC Medium Density)
part A pins: 1 S, 2 G, 6 D
part B pins: 3 D, 4 S, 5 G

## MOSFET-SWB030R04VT
designator Q?, comment SWB030R04VT
N-Channel MOSFET,  40V 130A  2.8mΩ; Published: 24-Mar-1999; LatestRevisionDate: 29-May-2009; LatestRevisionNote: IPC-7351 Footprint Added.; PackageVersion: Sep-2000; PackageReference: SOT-343; Publisher: Altium Limited; PackageDescription: 4-Pin SOT-343 Package 1.3 mm Pitch, 2.1 mm Lead Span
footprint TO-263-2
pins: 1 G, 2 D, 3 S

## MOSFET-TPH3R704PL
designator Q?, comment TPH3R704PL,L1Q
N Channel Mosfet 40V 92A dfn-8
footprint POWERDI3333-8_L3.3-W3.3-P0.65-BL
pins: 1 G, 2 S, 3 D

## MOSFETN-2N7002
designator Q?, comment 2N7002
N Channel Mosfet
footprint SOT23
pins: 1 "Gate", 2 "Source", 3 "Drain"

## MOSFETN-IRLR2905
designator U?, comment IRLR2905  (value not drawn)
55V 42A  27mΩ  TO-252
footprint TO252
pins: 1 G, 2 S, 3 D

## MOSFETN-WSD4066DN
designator U?, comment WSD4066DN  (value not drawn)
Dual Mosfet in one package
footprint DFN-8_L3.2-W3.1-P0.65-LS3.4-BL-EP; pin to pad 6>5+6 8>7+8
part A pins: 1 S1, 2 G1, 8 D1
part B pins: 3 S2, 4 G2, 6 D2

## MOUNTING_HOLE_2.5MM_PLATED
designator MH?, comment MOUNTING_HOLE_2MM
footprint MOUNTINGHOLE_2.5_PLATED
pins: MOUNT 3

## MOUNTING_HOLE_2MM
designator MH?
footprint MOUNTING_HOLE_2MM
footprint MOUNTING_HOLE_3.5mm
pins: MOUNT 3

## MOUNTING_HOLE_3MM_STANDOFF
designator PB_MH1, comment MOUNTING HOLE 3MM SOLDER STANDOFF  (no BOM)
Mounting Hole for Solder Standoff, M3 Screw, Plated, Round Pad; Category: Mounting-Hole; Status: Production
footprint STANDOFF_SOLDER_3MM
pins: 1 hidden

## MOUNTING_HOLE_3MM_STANDOFF_1
designator PB_MH1, comment MOUNTING HOLE 3MM SOLDER STANDOFF  (no BOM)
Mounting Hole for Solder Standoff, M3 Screw, Plated, Round Pad; Category: Mounting-Hole; Status: Production
footprint STANDOFF_SOLDER_3MM
pins: 1 hidden

## MP1584EN
designator U?  Name: MP1584EN
footprint SOIC-8E _GND (SOIC, 8-Leads, Body 4.90x3.90mm, Pitch 1.27mm, IPC Medium Density); pin to pad 5>5+9
pins: 1 SW (power), 2 EN/SYNC, 3 COM, 4 FB (power), 5 GND, 6 FRE, 7 VIN, 8 BST

## MP2315
designator IC?, comment TIMERChanged DIP package to have round (not oval) pin pads    http://www.ladyada.net/library/pcb/eaglelibrary.html
footprint SOT23-8
pins: 1 AAM (power), 2 IN, 3 SW, 4 GND (power), 5 BST, 6 EN, 7 VCC, 8 FB

## MPQ6610
designator U?, comment MPQ6610  DC Motor Drivers  (value not drawn)
SOIC-8 Brushed DC Motor Drivers ROHS
footprint SOIC-8_L4.9-W3.9-P1.27-LS6.0-BL
footprint SOIC-8E (SOIC, 8-Leads, Body 4.90x3.90mm, Pitch 1.27mm, IPC Medium Density)
pins: 1 BST (power), 2 VIN, 3 OUT, 4 GND, 5 nFAULT, 6 ISET, 7 IN, 8 EN (power)

## MPU6050
designator U?
footprint MPU6050
pins: 1 CLKIN (power), 6 AUX_DA (power), 7 AUX_CL, 8 VLOGIC, 9 AD0, 10 REGOUT, 11 FSYNC, 12 INT, 13 VDD, 18 GND, 19 RESV, 20 CPOUT, 21 RESV, 22 SLKOUT, 23 SCL, 24 SDA

## MPXV4006GP
designator PS1
Pressure Sensor 0.87PSI _6kPa_ Vented Gauge Male - 0.13 _3.17mm_ Tube 0.2 V ~ 4.7 V 8-SMD, Gull Wing, Side Port; DETAILS: Board Mount Pressure Sensors SOP TOP PORT; MFG: NXP Semiconductors; MFGPN: MPXV4006GP; PACKAGE: TOP PORT; URL: https://www.mouser.co.uk/ProductDetail/NXP-Semiconductors/MPXV4006GP?qs=r8OyiFxb6RebIOUWIUZL2A%3D%3D
footprint SOP8-1369
pins: 1 OUT, 2 Vcc (power), 3 GND (power), 4 OUT

## N36
designator IC?, comment N36 KE-2N23F-36
Opto Encoder
footprint KE2N236
pins: 1 AN, 2 CT, 3 CHA, 4 VCC, 5 GND, 6 CHB

## NAU7802SGI
designator U?
Manufacturer: NUVOTON(新唐); Add into BOM: yes; Interface: I2C; number of channels: 2; Supply Voltage: 2.7V~5.5V; sampling frequency: 80Hz; resolution: 24Bit; Symbol: NAU7802SGI; Device: NAU7802SGI; Supplier: LCSC; Supplier Part: C2614351; Manufacturer Part: NAU7802SGI; JLCPCB Part Class: Extended Part; LCSC Part Name: NAU7802SGI; Supplier Footprint: SOP-16; Datasheet: https://atta.szlcsc.com/upload/public/pdf/source/20210417/C2614351_F0E6A78D6A0A2C65262CB499A8BCF368.pdf; Convert to PCB: yes; differential input: Yes; Operating Temperature: -40℃~+85℃
footprint SOP-16_L9.9-W3.9-P1.27-LS6.0-BL
pins: 1 REFP, 2 VIN1N, 3 VIN1P, 4 VIN2N, 5 VIN2P, 6 VBG, 7 REFN, 8 AVSS, 9 DVSS, 10 XIN, 11 XOUT, 12 DRDY, 13 SCLK, 14 SDIO, 15 DVDD, 16 AVDD/LDO

## NCV4264-Regulator
designator U?
footprint SOT223
pins: 1 Vin, 2 GND, 3 Vout

## NE555
designator IC?, comment TIMERChanged DIP package to have round (not oval) pin pads    http://www.ladyada.net/library/pcb/eaglelibrary.html  (value not drawn)
footprint DIL08-ROUND
pins: 1 GND (power), 2 TR, 3 Q (out), 4 R, 5 CV, 6 THR, 7 DIS, 8 V+ (power)

## NESDCARDSD-
designator ?
footprint SD-CARD
pins: 1 DATA2, 2 CS, 3 DATA_IN, 4 VDD (oe), 5 SCLK, 6 GND (oe), 7 DATA_OUT (out), 8 DATA1

## NET-LABLE
designator TP?, comment TP  (value not drawn)  (no BOM)
Testpoint, through hole; Part Number: Testpoint TH; Artikkelnr Noca: N.A.; Manufacturer: *; Manufacturer Part Number: *; Datasheet: *; Footprint Doc: TESTPAD-TH; LatestRevisionDate: 2009-12-12; Pin Count: 1; Publisher: Nordic Semiconductor; Published: 2009-12-12; Value: TP; Note: *; Supplier: *; Supplier part number: *; 2nd source Supplier: *; 2nd source part number: *; Artikkelnr Simpro: N.A.
pins: 1

## NetTie_SMD
designator NT?  (value not drawn)  (no BOM)
Jumper, 2-Pin
signal-integrity model Connector
footprint JUMPER-NT
pins: 1, 2

## Nordic Logo
designator LOGO?, comment Nordic Logo M  (no BOM)
Nordic Logo, medium size; Artikkelnr Noca: N.A.; Part Number: Nordic Logo M; Manufacturer: *; Manufacturer Part Number: *; Datasheet: *; LatestRevisionDate: 2010-02-18; Publisher: Nordic Semiconductor; Value: Nordic Logo M; Note: *; Supplier: *; Supplier part number: *; 2nd source Supplier: *; 2nd source part number: *; Pin Count: 2; Published: 2010-02-18; Footprint Doc: NORDIC_LOGO_M; Artikkelnr Simpro: N.A.
footprint NORDIC_LOGO_M

## NPN
designator Q?
NPN Bipolar Transistor; Published: 8-Jun-2000; LatestRevisionDate: 17-Jul-2002; LatestRevisionNote: Re-released for DXP Platform.; PackageReference: TO-226-AA; Publisher: Altium Limited; PackageDescription: TO, Flat Index; 3 In-Line, Axial Leads; Body Dia. 4.8mm; Leads 0.55 x 0.51 mm (max); Code_JEDEC: TO-226-AA
simulation model NPN
signal-integrity model NPN
footprint SOT23
pins: 1 B, 2 E, 3 C

## nRF52832_QFAA
designator U?, comment nRF52832-QFAA
Multi-protocol Bluetooth Low Energy and 2.4GHz proprietary system-on-chip; Manufacturer: Nordic Semiconductor; Artikkelnr Noca: N.A.; Part Number: nRF52832-QFAA; Manufacturer Part Number: nRF52832-QFAA; Datasheet: *; LatestRevisionDate: 2014-11-26; Pin Count: 48; Publisher: Nordic Semiconductor; Published: 2014-11-26; Value: nRF52832-QFAA; Note: *; Supplier: Nordic Semiconductor; Supplier part number: *; 2nd source Supplier: *; 2nd source part number: *; Footprint Doc: QFN-48; Artikkelnr Simpro: N.A.
footprint QFN40P600X600X90-48N
pins: 1 DEC1 (power), 2 P0.00/XL1 (io), 3 P0.01/XL2 (io), 4 P0.02/AIN0 (io), 5 P0.03/AIN1 (io), 6 P0.04/AIN2 (io), 7 P0.05/AIN3 (io), 8 P0.06 (io), 9 P0.07 (io), 10 P0.08 (io), 11 P0.09 (io), 12 P0.10 (io), 13 VDD (power), 14 P0.11 (io), 15 P0.12 (io), 16 P0.13 (io), 17 P0.14 (io), 18 P0.15 (io), 19 P0.16 (io), 20 P0.17 (io), 21 P0.18 (io), 22 P0.19 (io), 23 P0.20 (io), 24 P0.21/RESET (io), 25 SWDCLK (in), 26 SWDIO (io), 27 P0.22 (io), 28 P0.23 (io), 29 P0.24 (io), 30 ANT (io), 31 VSS (power), 32 DEC2 (power), 33 DEC3 (power), 34 XC1 (in), 35 XC2 (out), 36 VDD (power), 37 P0.25 (io), 38 P0.26 (io), 39 P0.27 (io), 40 P0.28/AIN4 (io), 41 P0.29/AIN5 (io), 42 P0.30/AIN6 (io), 43 P0.31/AIN7 (io), 44 N.C. (power), 45 VSS (power), 46 DEC4 (power), 47 DCC (out), 48 VDD (power), 49 GND (power) hidden to GND
text: nRF52832
